# Altium footprint library Selex_PCBLib.PcbLib: 388 footprints (part 19 of 25)
Each footprint in its own frame and in the unit in brackets; x right, y up, seen from the top. Pads: shape width x height; smd on the part's side, far side on the other; paste and mask are expansions set on the pad; w line width, h text height; cw(c..) or ccw(c..) is an arc to the next point about the centre after c.
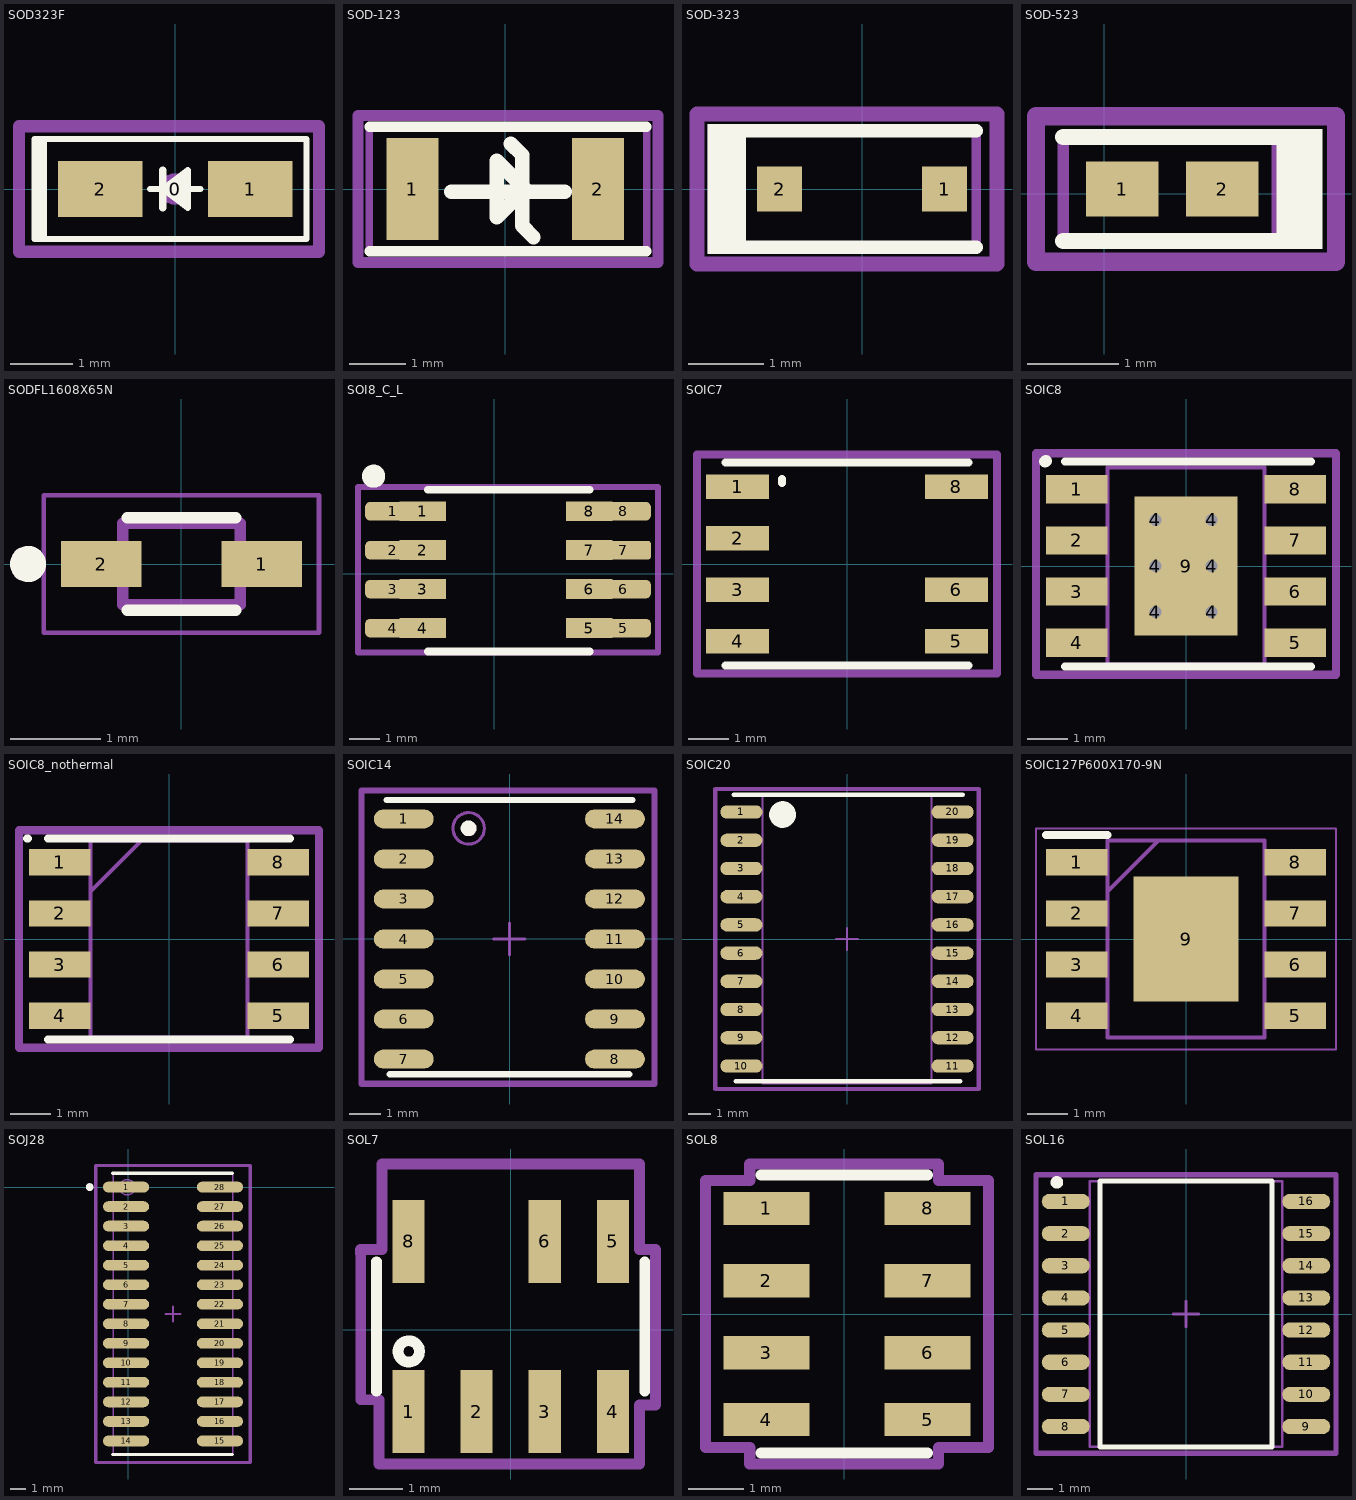
[diagram p18: the footprints below, top view; thin cyan lines are the x and y axes]

## SOD323F [mm] "SOD-323; 2 Leads; Body 2.7 x 1.6 mm, (LxW)"
height 1.35
pads (3):
  round 0.508 on Mech14: 0(0,0)
  rect 1.35x0.9 smd: 1(1.2,0) 2(-1.2,0)
Top Overlay:
  region: 0.2,0.3 0.2,-0.3 -0.2,0
  lines w0.1: -2.175,-0.8 -2.175,0.8 ; -2.15,0.8 -2.175,0.8 ; -0.4,0 -0.2,0 ; 0.2,0 0.4,0 ; -2.2,0.8 -2.1,0.8 ; -2.2,0.8 -2.25,0.8 -2.25,-0.8 -2.1,-0.8 ; -2.2,0.8 -2.175,0.8 ; -2.1,-0.8 2.1,-0.8 2.1,0.8 0,0.8 -2.1,0.8 ; -2.1,-0.8 -2.1,0.8 ; -0.2,0 0.2,0.3 0.2,-0.3 -0.2,0
  lines w0.127: -0.2,-0.3 -0.2,0.3
Mechanical 7:
  lines w0.2: -2.5,-1 -2.5,1 0,1 2.3,1 2.3,-1 -2.5,-1
3D body "SOD323F.STEP": height 1, standoff 0, extent -1.25,-0.675 1.25,0.675

## SOD-123 [mm]
pads (2):
  rect 0.915x1.8 smd: 1(-1.637,0) 2(1.637,0)
Top Overlay:
  lines w0.178: -2.4,-1.1 2.5,-1.1 ; -2.4,1.1 2.5,1.1
  lines w0.254: -0.95,-0.05 1.05,-0.05 ; 0.1,0.8 0.3,0.6 0.3,-0.05 -0.15,-0.5 -0.15,0.5 0.4,-0.05 0.55,-0.05 ; 0.3,0.05 0.3,-0.65 0.5,-0.85
Mechanical 5:
  lines w0.127: -2.413,1.079 2.5,1.079 2.5,-1.079 -2.4,-1.079
  text ".Designator" at -1.956,-0.33 h0.76
Mechanical 7:
  lines w0.2: -2.6,-1.3 -2.6,1.3 0,1.3 2.7,1.3 2.7,-1.3 -2.6,-1.3
Mechanical 13:
  lines w0.127: -2.4,-1.1 -2.4,1.1
3D body "CDBM.step": height 0.82, standoff 0, extent -1.956,-0.902 1.956,0.902

## SOD-323 [mm]
pads (2):
  rect 0.6x0.6 smd paste-0.05: 1(1.1,0) 2(-1.1,0)
Top Overlay:
  rectangle: -2.057,-0.864 -1.549,0.864
  lines w0.178: -1.803,-0.775 0.1,-0.775 1.525,-0.775 ; -1.803,0.775 0.1,0.775 1.525,0.775
Mechanical 5:
  rectangle: -2.057,-0.864 -1.549,0.864
  lines w0.127: -1.803,-0.775 0.1,-0.775 1.525,-0.775 1.525,0.775 0.1,0.775 -1.803,0.775
  text ".Designator" at -1.4,-0.275 h0.76
Mechanical 7:
  lines w0.2: -2.2,-1 -2.2,1 -0.3,1 1.8,1 1.8,-1 -2.2,-1
3D body "SOD-323.stp": height 1.1, standoff 0, extent -1.3,-0.675 1.3,0.675

## SOD-523 [mm]
pads (2):
  rect 0.8x0.6 smd paste-0.05: 1(0.2,0.05) 2(1.3,0.05)
Top Overlay:
  region: 2.401,0.71 1.893,0.71 1.893,-0.61 2.401,-0.61
  lines w0.178: -0.45,-0.522 0.75,-0.522 2.225,-0.522 ; -0.45,0.621 0.75,0.621 2.225,0.621
Mechanical 5:
  region: 2.35,0.685 1.842,0.685 1.842,-0.585 2.35,-0.585
  lines w0.127: 2.225,-0.509 0.75,-0.509 -0.45,-0.496 -0.45,0.596 0.75,0.596 2.225,0.596
Mechanical 7:
  lines w0.2: -0.75,-0.75 -0.75,0.85 2.55,0.85 2.55,-0.75 -0.75,-0.75
3D body "SOD-523F.stp": height 0.72, standoff 0.02, extent -0.1,-0.348 1.5,0.45

## SODFL1608X65N [mil]
pads (2):
  rect 35x20 smd: 1(35,0) 2(-35,0)
Top Overlay:
  circle w7.87: c-66.93,0 r3.94
  lines w5: -23.62,-20.28 23.62,-20.28 ; -23.62,20.28 23.62,20.28
Mechanical 13:
  circle w7.87: c-66.93,0 r3.94
  lines w5: -25.59,-17.72 -25.59,17.72 25.59,17.72 25.59,-17.72 -25.59,-17.72
Mechanical 15:
  lines w1.97: -60,-30 -60,30 60,30 60,-30 -60,-30
3D body "1N4148WS RRG.STEP": height 35.06, standoff -0.37, extent -49.21,-24.6 49.21,24.61

## SOI8_C_L [mm] "SOI8_C_L"
pads (16):
  rrect50% 1.8x0.6 smd: 1(-3.31,2.032) 2(-3.31,0.762) 3(-3.31,-0.508) 4(-3.31,-1.778) 5(4.199,-1.778) 6(4.199,-0.508) 8(4.199,2.032)
  rect 1.525x0.65 smd: 1(-2.331,2.032) 2(-2.331,0.762) 3(-2.331,-0.508) 4(-2.331,-1.778) 5(3.093,-1.778) 6(3.093,-0.508) 7(3.093,0.762) 8(3.093,2.032)
  rrect25% 1.8x0.6 smd: 7(4.199,0.762)
Top Overlay:
  circle w0.5: c-3.937,3.175 r0.127
  lines w0.254: -2.167,-2.54 3.108,-2.54 ; -2.167,2.735 3.108,2.735
Mechanical 15:
  lines w0.2: -4.445,-2.573 5.334,-2.573 5.334,2.827 -4.445,2.827 -4.445,-2.573
3D body "User Library-SOP2-8.step": height 1.9, standoff 0, extent -3.556,-2.569 4.578,2.921

## SOIC7 [mm] "SOIC_7_1p27x5p4"
pads (7):
  rect 1.55x0.6 smd paste+0.1: 1(-2.7,1.905) 2(-2.7,0.635) 3(-2.7,-0.635) 4(-2.7,-1.905) 5(2.7,-1.905) 6(2.7,-0.635) 8(2.7,1.905)
Top Overlay:
  lines w0.2: -3,-2.5 3,-2.5 ; -3,2.5 3,2.5 ; -1.6,2 -1.6,2.1
Mechanical 15:
  lines w0.2: -3.7,-2.7 -3.7,2.7 3.7,2.7 3.7,-2.7 -3.7,-2.7
3D body "User Library-SOIC-7.STEP": height 1.75, standoff 0, extent -3,-2.475 3,2.425

## SOIC8 [mm] "MP9486A, SOIC_8_1p27X5p4"
pads (15):
  rect 1.525x0.7 smd: 1(-2.712,1.905) 2(-2.712,0.635) 3(-2.712,-0.635) 4(-2.712,-1.905) 5(2.712,-1.905) 6(2.712,-0.635) 7(2.712,0.635) 8(2.712,1.905)
  round 0.6 hole 0.3: 4(-0.762,-1.143) 4(-0.762,0) 4(-0.762,1.143) 4(0.635,-1.143) 4(0.635,0) 4(0.635,1.143)
  rect 2.56x3.45 smd: 9(0,0)
Top Overlay:
  lines w0.2: -3,-2.5 3.1,-2.5 ; -3,2.6 3.1,2.6
  lines w0.3: -3.5,2.6 -3.475,2.605
Mechanical 13:
  lines w0.1: -1.95,-2.45 1.95,-2.45 1.95,2.45 -1.95,2.45 -1.95,-2.45
Mechanical 15:
  lines w0.2: -3.725,-2.7 3.725,-2.7 3.725,2.8 -3.725,2.8 -3.725,-2.7
3D body "MP9486GN.stp": height 0, standoff 0, extent 0,0 0,0

## SOIC8_nothermal [mm] "SOIC_8_1P27X5P4_nothermal"
pads (8):
  rect 1.525x0.65 smd: 1(-2.712,1.905) 2(-2.712,0.635) 3(-2.712,-0.635) 4(-2.712,-1.905) 5(2.712,-1.905) 6(2.712,-0.635) 7(2.712,0.635) 8(2.712,1.905)
Top Overlay:
  lines w0.2: -3.525,2.5 -3.5,2.5 ; -3,-2.5 3,-2.5 ; -3,2.5 3,2.5
Mechanical 13:
  lines w0.1: -1.95,1.18 -0.68,2.45 ; -1.95,-2.45 1.95,-2.45 1.95,2.45 -1.95,2.45 -1.95,-2.45
Mechanical 15:
  lines w0.2: -3.725,-2.7 3.725,-2.7 3.725,2.7 -3.725,2.7 -3.725,-2.7
3D body "NE555DR.stp": height 1.75, standoff 0, extent -3,-2.45 3,2.45

## SOIC14 [mm] "SOIC_14_1p27x6p7"
pads (14):
  oval 1.9x0.6 smd: 1(-3.357,3.799) 2(-3.357,2.529) 3(-3.357,1.259) 4(-3.357,-0.011) 5(-3.357,-1.281) 6(-3.357,-2.551) 7(-3.357,-3.821) 8(3.343,-3.821) 9(3.343,-2.551) 10(3.343,-1.281) 11(3.343,-0.011) 12(3.343,1.259) 13(3.343,2.529) 14(3.343,3.799)
Top Overlay:
  circle w0.25: c-1.3,3.5 r0.125
  lines w0.2: -3.9,4.4 3.9,4.4 ; -3.8,-4.3 3.8,-4.3
Mechanical 13:
  circle w0.1: c-1.3,3.5 r0.5
Mechanical 15:
  lines w0.1: -0.507,-0.011 0.493,-0.011 ; -0.007,-0.511 -0.007,0.489
  lines w0.2: -4.7,-4.6 4.6,-4.6 4.6,4.7 -4.7,4.7 -4.7,-4.6
3D body "D14-M.stp": height 1.76, standoff 0, extent -3.106,-4.38 3.092,4.358

## SOIC20 [mm] "SOIC, 20-Leads, Body 12.80x7.50mm, Pitch 1.27mm, IPC Medium Density, SOIC_20_1P27x9P3"
height 2.65
pads (20):
  oval 1.9x0.6 smd: 1(-4.75,5.715) 2(-4.75,4.445) 3(-4.75,3.175) 4(-4.75,1.905) 5(-4.75,0.635) 6(-4.75,-0.635) 7(-4.75,-1.905) 8(-4.75,-3.175) 9(-4.75,-4.445) 10(-4.75,-5.715) 11(4.75,-5.715) 12(4.75,-4.445) 13(4.75,-3.175) 14(4.75,-1.905) 15(4.75,-0.635) 16(4.75,0.635) 17(4.75,1.905) 18(4.75,3.175) 19(4.75,4.445) 20(4.75,5.715)
Top Overlay:
  circle w0.6: c-2.9,5.6 r0.3
  lines w0.2: -5.1,6.5 5.2,6.5 ; -5,-6.4 5.1,-6.4
Mechanical 13:
  circle w0.1: c-2.9,5.6 r0.5
  lines w0.1: -3.8,-6.5 3.8,-6.5 3.8,6.5 -3.8,6.5 -3.8,-6.5
Mechanical 15:
  lines w0.1: -0.5,0 0.5,0 ; 0,-0.5 0,0.5
  lines w0.2: -5.925,-6.75 5.925,-6.75 5.925,6.75 -5.925,6.75 -5.925,-6.75
3D body "User Library-SOIC20.STEP": height 2.25, standoff 0.01, extent -5.067,-6.3 5.067,6.3

## SOIC127P600X170-9N [mm]
pads (9):
  rect 1.525x0.65 smd: 1(-2.712,1.905) 2(-2.712,0.635) 3(-2.712,-0.635) 4(-2.712,-1.905) 5(2.712,-1.905) 6(2.712,-0.635) 7(2.712,0.635) 8(2.712,1.905)
  rect 2.6x3.1 smd: 9(0,0)
Top Overlay:
  lines w0.2: -3.475,2.58 -1.95,2.58
Mechanical 13:
  lines w0.1: -1.95,1.18 -0.68,2.45 ; -1.95,-2.45 -1.95,2.45 1.95,2.45 1.95,-2.45 -1.95,-2.45
Mechanical 15:
  lines w0.05: -3.725,-2.75 -3.725,2.75 3.725,2.75 3.725,-2.75 -3.725,-2.75
3D body "TPS5430DDAR.stp": height 1.57, standoff 0, extent -3.014,-2.45 3.014,2.45

## SOJ28 [mm] "SOJ_28_1P27_6P0"
pads (28):
  oval 3x0.7 smd: 1(-0.129,0) 2(-0.129,-1.27) 3(-0.129,-2.54) 4(-0.129,-3.81) 5(-0.129,-5.08) 6(-0.129,-6.35) 7(-0.129,-7.62) 8(-0.129,-8.89) 9(-0.129,-10.16) 10(-0.129,-11.43) 11(-0.129,-12.7) 12(-0.129,-13.97) 13(-0.129,-15.24) 14(-0.129,-16.51) 15(5.971,-16.51) 16(5.971,-15.24) 17(5.971,-13.97) 18(5.971,-12.7) 19(5.971,-11.43) 20(5.971,-10.16) 21(5.971,-8.89) 22(5.971,-7.62) 23(5.971,-6.35) 24(5.971,-5.08) 25(5.971,-3.81) 26(5.971,-2.54) 27(5.971,-1.27) 28(5.971,0)
Top Overlay:
  circle w0.25: c-2.5,0 r0.125
  lines w0.2: -1,-17.4 6.8,-17.4 ; -1,0.9 6.8,0.9
Mechanical 13:
  circle w0.1: c-0.054,-0.015 r0.5
  lines w0.1: -0.954,-17.395 -0.954,0.885 6.796,0.885 6.796,-17.395 -0.954,-17.395
Mechanical 15:
  lines w0.1: 2.421,-8.255 3.421,-8.255 ; 2.921,-8.755 2.921,-7.755
  lines w0.2: -2.104,-17.905 -2.104,1.395 7.946,1.395 7.946,-17.905 -2.104,-17.905
3D body "User Library-SOJ-28-V21-300.STEP": height 3.52, standoff 0, extent -1.529,-17.463 7.371,0.952

## SOL7 [mm] "SOL_7_1p27_2p19"
pads (7):
  rect 0.6x1.55 smd paste+0.1: 1(-1.905,-1.524) 2(-0.635,-1.524) 3(0.635,-1.524) 4(1.905,-1.524) 5(1.905,1.651) 6(0.635,1.651) 8(-1.905,1.651)
Top Overlay:
  circle w0.2: c-1.9,-0.4 r0.2
  lines w0.2: -2.5,-1.143 -2.5,1.27 ; 2.5,-1.143 2.5,1.27
Mechanical 15:
  lines w0.2: -2.8,1.5 -2.794,1.306 -2.794,-1.3 -2.457,-1.3 -2.457,-1.637 -2.457,-2.5 -1.294,-2.5 1.7,-2.5 2.4,-2.5 2.4,-1.7 2.4,-1.4 2.7,-1.4 2.7,-1.2 2.7,1.5 2.4,1.5 2.4,3.094 -2.4,3.094 -2.4,1.7 -2.4,1.5 -2.8,1.5
3D body "User Library-SOIC-7.STEP": height 1.75, standoff 0, extent -2.425,-3 2.475,3

## SOL8 [mm] "SOL 8 1p27-2p1"
pads (8):
  rect 1.55x0.6 smd paste+0.1 mask+0.07: 1(-1.4,1.9)
  rect 1.55x0.6 smd paste+0.1: 2(-1.4,0.6) 3(-1.4,-0.7) 4(-1.4,-1.9) 5(1.5,-1.9) 6(1.5,-0.7) 7(1.5,0.6) 8(1.5,1.9)
Top Overlay:
  lines w0.2: -1.5,-2.5 1.5,-2.5 ; -1.5,2.5 1.5,2.5 ; -1,1.95 -1,1.975
Mechanical 15:
  lines w0.2: -2.5,-2.4 -1.7,-2.4 -1.7,-2.7 1.7,-2.7 1.7,-2.4 2.6,-2.4 2.6,2.4 1.7,2.4 1.7,2.7 -1.7,2.7 -1.7,2.4 -2.5,2.4 -2.5,-2.4
3D body "User Library-so8-3.STEP": height 1.7, standoff 0, extent -2.9,-2.475 3.1,2.425

## SOL16 [mm] "SOIC, 16-Leads, Body 10.30x7.49mm, Pitch 1.27mm, IPC Medium Density"
height 2.65
pads (16):
  oval 1.9x0.6 smd: 1(-4.75,4.445) 2(-4.75,3.175) 3(-4.75,1.905) 4(-4.75,0.635) 5(-4.75,-0.635) 6(-4.75,-1.905) 7(-4.75,-3.175) 8(-4.75,-4.445) 9(4.75,-4.445) 10(4.75,-3.175) 11(4.75,-1.905) 12(4.75,-0.635) 13(4.75,0.635) 14(4.75,1.905) 15(4.75,3.175) 16(4.75,4.445)
Top Overlay:
  circle w0.25: c-5.1,5.2 r0.125
  lines w0.2: -3.4,-5.25 3.4,-5.25 3.4,5.25 -3.4,5.25 -3.4,-5.25
Mechanical 13:
  lines w0.1: -3.8,-5.25 3.8,-5.25 3.8,5.25 -3.8,5.25 -3.8,-5.25
Mechanical 15:
  lines w0.1: -0.5,0 0.5,0 ; 0,-0.5 0,0.5
  lines w0.2: -5.925,-5.5 5.925,-5.5 5.925,5.5 -5.925,5.5 -5.925,-5.5
3D body "CircuitWorks-SOL-16.STEP": height 1.75, standoff 0, extent -4.7,-4.8 4.6,5.2